# Altium footprint library Devkit.PcbLib: 84 footprints (part 2 of 6)
Each footprint in its own frame and in the unit in brackets; x right, y up, seen from the top. Pads: shape width x height; smd on the part's side, far side on the other; paste and mask are expansions set on the pad; w line width, h text height; cw(c..) or ccw(c..) is an arc to the next point about the centre after c.
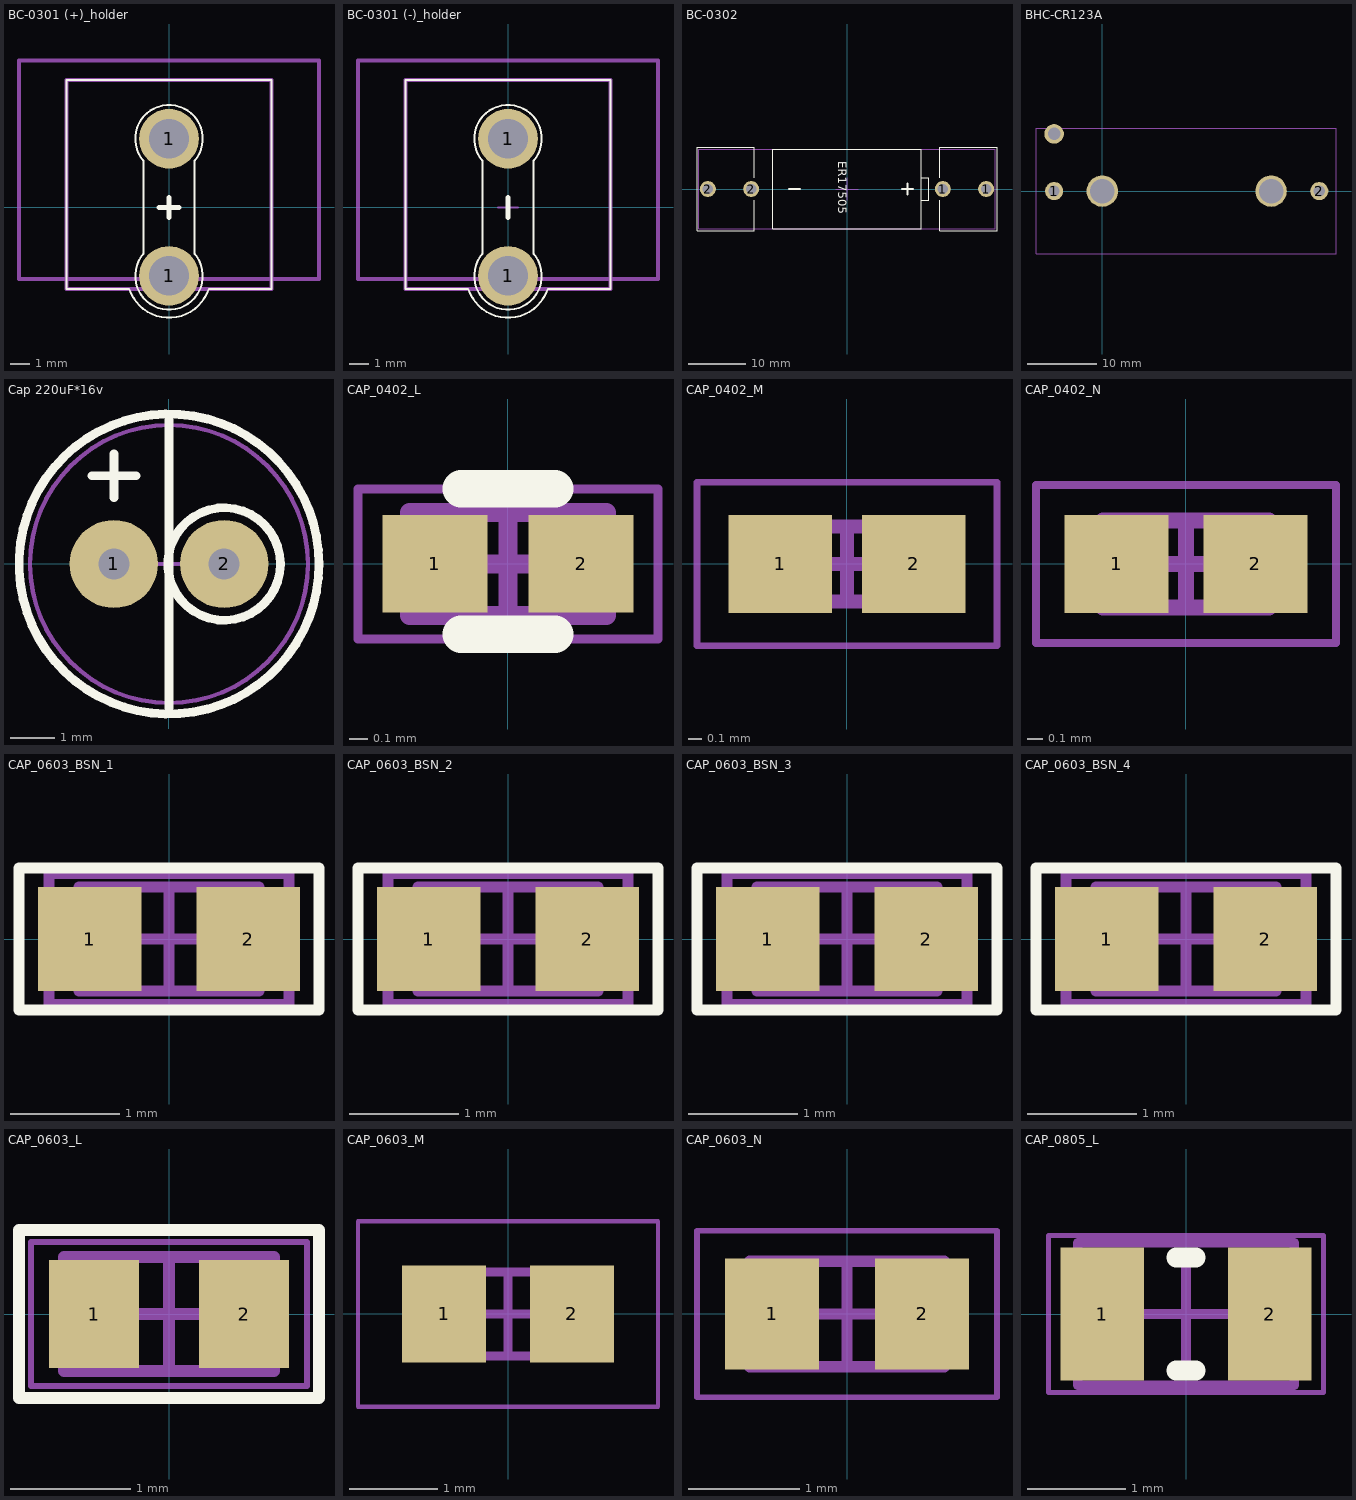
[diagram p1: the footprints below, top view; thin cyan lines are the x and y axes]

## BC-0301 (+)_holder [mm]
height 14.7
pads (2):
  round 3 hole 2: 1(0,-3.45) 1(0,3.45)
Top Overlay:
  lines w0.1: -2.002,-4.1 -5.15,-4.1 -5.15,6.4 5.15,6.4 5.15,-4.1 2.002,-4.1 cw(c0,-3.45) -2.001,-4.103 ; -1.292,-2.345 ccw(c0,-3.45) 1.292,-2.345 1.292,2.345 ccw(c0,3.45) -1.292,2.345 -1.292,-2.345
  lines w0.254: -0.5,0 0.5,0 ; 0,-0.5 0,0.5
Bottom Overlay:
  lines w0.1: -1.292,-2.345 ccw(c0,-3.45) 1.292,-2.345 1.292,2.345 ccw(c0,3.45) -1.292,2.345 -1.292,-2.345
  lines w0.254: -0.5,0 0.5,0 ; 0,-0.5 0,0.5
Mechanical 13:
  lines w0.2: -7.55,-3.6 -7.55,7.4 7.55,7.4 7.55,-3.6 -7.55,-3.6
Mechanical 15:
  lines w0.1: -0.5,0 0.5,0 ; 0,-0.5 0,0.5
  lines w0.2: -5.15,-4.1 -5.15,6.4 5.15,6.4 5.15,-4.1 -5.15,-4.1
3D body "GL2003 AA Battery Clip MPD BK-92 by spencer.wright-1.stp": height 15.36, standoff -4.03, extent -7.405,-3.6 7.405,5.918

## BC-0301 (-)_holder [mm]
height 14.7
pads (2):
  round 3 hole 2: 1(0,-3.45) 1(0,3.45)
Top Overlay:
  lines w0.1: -2.002,-4.1 -5.15,-4.1 -5.15,6.4 5.15,6.4 5.15,-4.1 2.002,-4.1 cw(c0,-3.45) -2.001,-4.103 ; -1.292,-2.345 ccw(c0,-3.45) 1.292,-2.345 1.292,2.345 ccw(c0,3.45) -1.292,2.345 -1.292,-2.345
  lines w0.254: 0,-0.5 0,0.5
Bottom Overlay:
  lines w0.1: -1.292,-2.345 ccw(c0,-3.45) 1.292,-2.345 1.292,2.345 ccw(c0,3.45) -1.292,2.345 -1.292,-2.345
  lines w0.254: 0,-0.5 0,0.5
Mechanical 13:
  lines w0.2: -7.55,-3.6 -7.55,7.4 7.55,7.4 7.55,-3.6 -7.55,-3.6
Mechanical 15:
  lines w0.1: -0.5,0 0.5,0 ; 0,-0.5 0,0.5
  lines w0.2: -5.15,-4.1 -5.15,6.4 5.15,6.4 5.15,-4.1 -5.15,-4.1
3D body "GL2003 AA Battery Clip MPD BK-92 by spencer.wright-1.stp": height 15.36, standoff -4.03, extent -7.405,-3.6 7.405,5.918

## BC-0302 [mm]
pads (4):
  round 2.8 hole 1.8: 1(16.8,0) 1(24.4,0) 2(-24.4,0) 2(-16.8,0)
Top Overlay:
  lines w0.2: -16.3,-2 -16.3,-7.3 -26.3,-7.3 -26.3,7.3 -16.3,7.3 -16.3,2 ; 13,-2 14.375,-2 14.375,2 13,2 ; 16.3,-2 16.3,-7.3 26.3,-7.3 26.3,7.3 16.3,7.3 16.3,2 ; -13,-7 -13,7 13,7 13,-7 -13,-7
  lines w0.3: -10.2,0 -8.2,0 ; 9.6,0 11.6,0 ; 10.6,-1 10.6,0 10.6,1
  text "ER17505" at -1.5,4.9 h1.5
Mechanical 15:
  lines w0.2: -2,0 2,0 ; 0,-2 0,2 ; -26,-7 26,-7 26,7 -26,7 -26,-7
3D body "bat_holder.STEP": height 15.79, standoff -1, extent -25.999,-7 -16.6,7
3D body "bat_holder.STEP": height 15.79, standoff -1, extent 16.6,-7 25.999,7

## BHC-CR123A [mm]
pads (5):
  round 2.6 hole 1.6: 1(-6.9,0) 2(31.1,0)
  round 2.8 hole 1.8: ""(-6.9,8.2)
  round 4.5 hole 3.5: ""(0,0) ""(24.2,0)
Mechanical 2:
  lines w0.1: -9.5,-9 -9.5,-0.5 -9.5,9 33.5,9 33.5,-9 -9.5,-9
3D body "BAT.STEP": height 14, standoff 0, extent -9.5,-9 33.5,9

## Cap 220uF*16v [mm] "Cap 220uF*16v  Panasonic EEU-FR1C221"
height 12.7
pads (2):
  round 2 hole 0.7: 1(-1.25,0) 2(1.25,0)
Top Overlay:
  circle w0.2: c1.25,0 r1.275
  circle w0.2: c0,0 r3.4
  lines w0.2: -1.75,2 -0.75,2 ; -1.25,1.5 -1.25,2.5 ; 0,-3.25 0,3.25
Bottom Overlay:
  circle w0.2: c0,0 r3.4
  circle w0.2: c1.25,0 r1.275
  lines w0.2: 0,-3.25 0,3.25 ; -1.75,2 -0.75,2 -1.75,2 ; -1.25,1.5 -1.25,2.5 -1.25,1.5
Top 3D Body:
  circle w0.1: c0,0 r3.15
Mechanical 15:
  circle w0.1: c0,0 r3.15
  lines w0.1: -0.5,0 0.5,0 ; 0,-0.5 0,0.5
3D body "User Library-CapAluRadial_D63H110.STEP": height 12.5, standoff -3, extent -3.4,-3.399 3.4,3.399

## CAP_0402_L [mm] "Chip Capacitor, 2-Leads, Body 1.05x0.55mm, IPC High Density"
height 0.55
pads (2):
  rect 0.56x0.52 smd: 1(-0.39,0) 2(0.39,0)
Top Overlay:
  lines w0.2: -0.25,-0.375 0.25,-0.375 ; -0.25,0.4 0.25,0.4
Mechanical 13:
  lines w0.1: -0.525,-0.275 -0.525,0.275 0.525,0.275 0.525,-0.275 -0.525,-0.275
Mechanical 15:
  lines w0.05: -0.8,-0.4 -0.8,0.4 0.8,0.4 0.8,-0.4 -0.8,-0.4
  lines w0.1: -0.275,0 0.275,0 ; 0,-0.275 0,0.275
3D body "CAPC1005X06L.step": height 0.55, standoff 0, extent -0.525,-0.275 0.525,0.275

## CAP_0402_M [mm] "Chip Capacitor, 2-Leads, Body 1.05x0.55mm, IPC Low Density"
height 0.55
pads (2):
  rect 0.76x0.72 smd: 1(-0.49,0) 2(0.49,0)
Mechanical 13:
  lines w0.1: -0.525,-0.275 -0.525,0.275 0.525,0.275 0.525,-0.275 -0.525,-0.275
Mechanical 15:
  lines w0.05: -1.1,-0.6 -1.1,0.6 1.1,0.6 1.1,-0.6 -1.1,-0.6
  lines w0.1: -0.275,0 0.275,0 ; 0,-0.275 0,0.275
3D body "CAPC1005X06M.step": height 0.55, standoff 0, extent -0.525,-0.275 0.525,0.275

## CAP_0402_N [mm] "Chip Capacitor, 2-Leads, Body 1.05x0.55mm, IPC Medium Density"
height 0.55
pads (2):
  rect 0.66x0.62 smd: 1(-0.44,0) 2(0.44,0)
Mechanical 13:
  lines w0.1: -0.525,-0.275 0.525,-0.275 0.525,0.275 -0.525,0.275 -0.525,-0.275
Mechanical 15:
  lines w0.05: -0.95,-0.5 0.95,-0.5 0.95,0.5 -0.95,0.5 -0.95,-0.5
  lines w0.1: -0.275,0 0.275,0 ; 0,-0.275 0,0.275
3D body "CAPC1005X06N.step": height 0.55, standoff 0, extent -0.525,-0.275 0.525,0.275

## CAP_0603_BSN_1 [mm] "2-Leads, Body 1.55x0.85mm"
height 0.5
pads (2):
  rect 0.95x0.95 smd: 1(-0.725,0) 2(0.725,0)
Top Overlay:
  lines w0.1: -1.375,-0.65 -1.375,0.65 1.375,0.65 1.375,-0.65 -1.375,-0.65
Mechanical 13:
  lines w0.1: -0.825,-0.475 -0.825,0.475 0.825,0.475 0.825,-0.475 -0.825,-0.475
Mechanical 15:
  lines w0.1: -0.475,0 0.475,0 ; 0,-0.475 0,0.475 ; -1.1,-0.6 1.1,-0.6 1.1,0.6 -1.1,0.6 -1.1,-0.6
3D body "User Library-CapCeramic_Kemet_0603_1608.STEP": height 0.8, standoff 0, extent -0.775,-0.4 0.825,0.4

## CAP_0603_BSN_2 [mm] "2-Leads, Body 1.55x0.85mm"
height 0.5
pads (2):
  rect 0.95x0.95 smd: 1(-0.725,0) 2(0.725,0)
Top Overlay:
  lines w0.1: -1.375,-0.65 1.375,-0.65 1.375,0.65 -1.375,0.65 -1.375,-0.65
Mechanical 13:
  lines w0.1: -0.825,-0.475 0.825,-0.475 0.825,0.475 -0.825,0.475 -0.825,-0.475
Mechanical 15:
  lines w0.1: -0.475,0 0.475,0 ; 0,-0.475 0,0.475 ; -1.1,-0.6 -1.1,0.6 1.1,0.6 1.1,-0.6 -1.1,-0.6
3D body "User Library-100pF Capacitors SMD 0603.STEP": height 0.63, standoff 0, extent -0.8,-0.405 0.8,0.405

## CAP_0603_BSN_3 [mm] "2-Leads, Body 1.55x0.85mm"
height 0.5
pads (2):
  rect 0.95x0.95 smd: 1(-0.725,0) 2(0.725,0)
Top Overlay:
  lines w0.1: -1.375,-0.65 -1.375,0.65 1.375,0.65 1.375,-0.65 -1.375,-0.65
Mechanical 13:
  lines w0.1: -0.825,-0.475 -0.825,0.475 0.825,0.475 0.825,-0.475 -0.825,-0.475
Mechanical 15:
  lines w0.1: -0.475,0 0.475,0 ; 0,-0.475 0,0.475 ; -1.1,-0.6 1.1,-0.6 1.1,0.6 -1.1,0.6 -1.1,-0.6
3D body "User Library-CAPC1608X09.STEP": height 0.9, standoff 0, extent -0.8,-0.4 0.8,0.4

## CAP_0603_BSN_4 [mm] "2-Leads, Body 1.55x0.85mm"
height 0.5
pads (2):
  rect 0.95x0.95 smd: 1(-0.725,0) 2(0.725,0)
Top Overlay:
  lines w0.1: -1.375,-0.65 -1.375,0.65 1.375,0.65 1.375,-0.65 -1.375,-0.65
Mechanical 13:
  lines w0.1: -0.825,-0.475 -0.825,0.475 0.825,0.475 0.825,-0.475 -0.825,-0.475
Mechanical 15:
  lines w0.1: -0.475,0 0.475,0 ; 0,-0.475 0,0.475 ; -1.1,-0.6 1.1,-0.6 1.1,0.6 -1.1,0.6 -1.1,-0.6
3D body "User Library-C0603-2.STEP": height 0.8, standoff 0, extent -0.8,-0.4 0.8,0.4

## CAP_0603_L [mm] "Chip Capacitor, 2-Leads, Body 1.60x0.80mm, IPC High Density"
height 0.92
pads (2):
  rect 0.75x0.9 smd: 1(-0.625,0) 2(0.625,0)
Top Overlay:
  lines w0.1: -1.25,-0.7 1.25,-0.7 1.25,0.7 -1.25,0.7 -1.25,-0.7
Mechanical 13:
  lines w0.1: -0.875,-0.475 -0.875,0.475 0.875,0.475 0.875,-0.475 -0.875,-0.475
Mechanical 15:
  lines w0.05: -1.15,-0.6 -1.15,0.6 1.15,0.6 1.15,-0.6 -1.15,-0.6
  lines w0.1: -0.475,0 0.475,0 ; 0,-0.475 0,0.475
3D body: height 0.92, standoff 0, extent -0.495,-0.475 0.495,0.475
3D body: height 0.92, standoff 0, extent -0.875,-0.475 -0.495,0.475
3D body: height 0.92, standoff 0, extent 0.495,-0.475 0.875,0.475

## CAP_0603_M [mm] "Chip Capacitor, 2-Leads, Body 1.60x0.80mm, IPC Low Density"
height 0.92
pads (2):
  rect 0.95x1.1 smd: 1(-0.725,0) 2(0.725,0)
Mechanical 13:
  lines w0.1: -0.875,-0.475 -0.875,0.475 0.875,0.475 0.875,-0.475 -0.875,-0.475
Mechanical 15:
  lines w0.05: -1.7,-1.05 -1.7,1.05 1.7,1.05 1.7,-1.05 -1.7,-1.05
  lines w0.1: -0.475,0 0.475,0 ; 0,-0.475 0,0.475
3D body: height 0.92, standoff 0, extent -0.495,-0.475 0.495,0.475
3D body: height 0.92, standoff 0, extent -0.875,-0.475 -0.495,0.475
3D body: height 0.92, standoff 0, extent 0.495,-0.475 0.875,0.475

## CAP_0603_N [mm] "Chip Capacitor, 2-Leads, Body 1.60x0.80mm, IPC Medium Density"
height 0.92
pads (2):
  rect 0.85x1 smd: 1(-0.675,0) 2(0.675,0)
Mechanical 13:
  lines w0.1: -0.875,-0.475 0.875,-0.475 0.875,0.475 -0.875,0.475 -0.875,-0.475
Mechanical 15:
  lines w0.05: -1.35,-0.75 1.35,-0.75 1.35,0.75 -1.35,0.75 -1.35,-0.75
  lines w0.1: -0.475,0 0.475,0 ; 0,-0.475 0,0.475
3D body: height 0.92, standoff 0, extent 0.495,-0.475 0.875,0.475
3D body: height 0.92, standoff 0, extent -0.875,-0.475 -0.495,0.475
3D body: height 0.92, standoff 0, extent -0.495,-0.475 0.495,0.475

## CAP_0805_L [mm] "Chip Capacitor, Body 2.0x1.2mm, Height 1.45mm, IPC High Density"
height 1.45
pads (2):
  rect 0.85x1.35 smd: 1(-0.85,0) 2(0.85,0)
Top Overlay:
  lines w0.2: -0.1,-0.575 0.1,-0.575 ; -0.1,0.575 0.1,0.575
Mechanical 13:
  lines w0.1: -1.1,-0.725 -1.1,0.725 1.1,0.725 1.1,-0.725 -1.1,-0.725
Mechanical 15:
  lines w0.05: -1.4,-0.8 -1.4,0.8 1.4,0.8 1.4,-0.8 -1.4,-0.8
  lines w0.1: -0.5,0 0.5,0 ; 0,-0.5 0,0.5
3D body: height 1.45, standoff 0, extent -0.6,-0.725 0.6,0.725
3D body: height 1.45, standoff 0, extent -1.1,-0.725 -0.6,0.725
3D body: height 1.45, standoff 0, extent 0.6,-0.725 1.1,0.725